# Altium footprint library SparkFun-Connectors.PCBLIB: 409 footprints (part 19 of 26)
Each footprint in its own frame and in the unit in brackets; x right, y up, seen from the top. Pads: shape width x height; smd on the part's side, far side on the other; paste and mask are expansions set on the pad; w line width, h text height; cw(c..) or ccw(c..) is an arc to the next point about the centre after c.
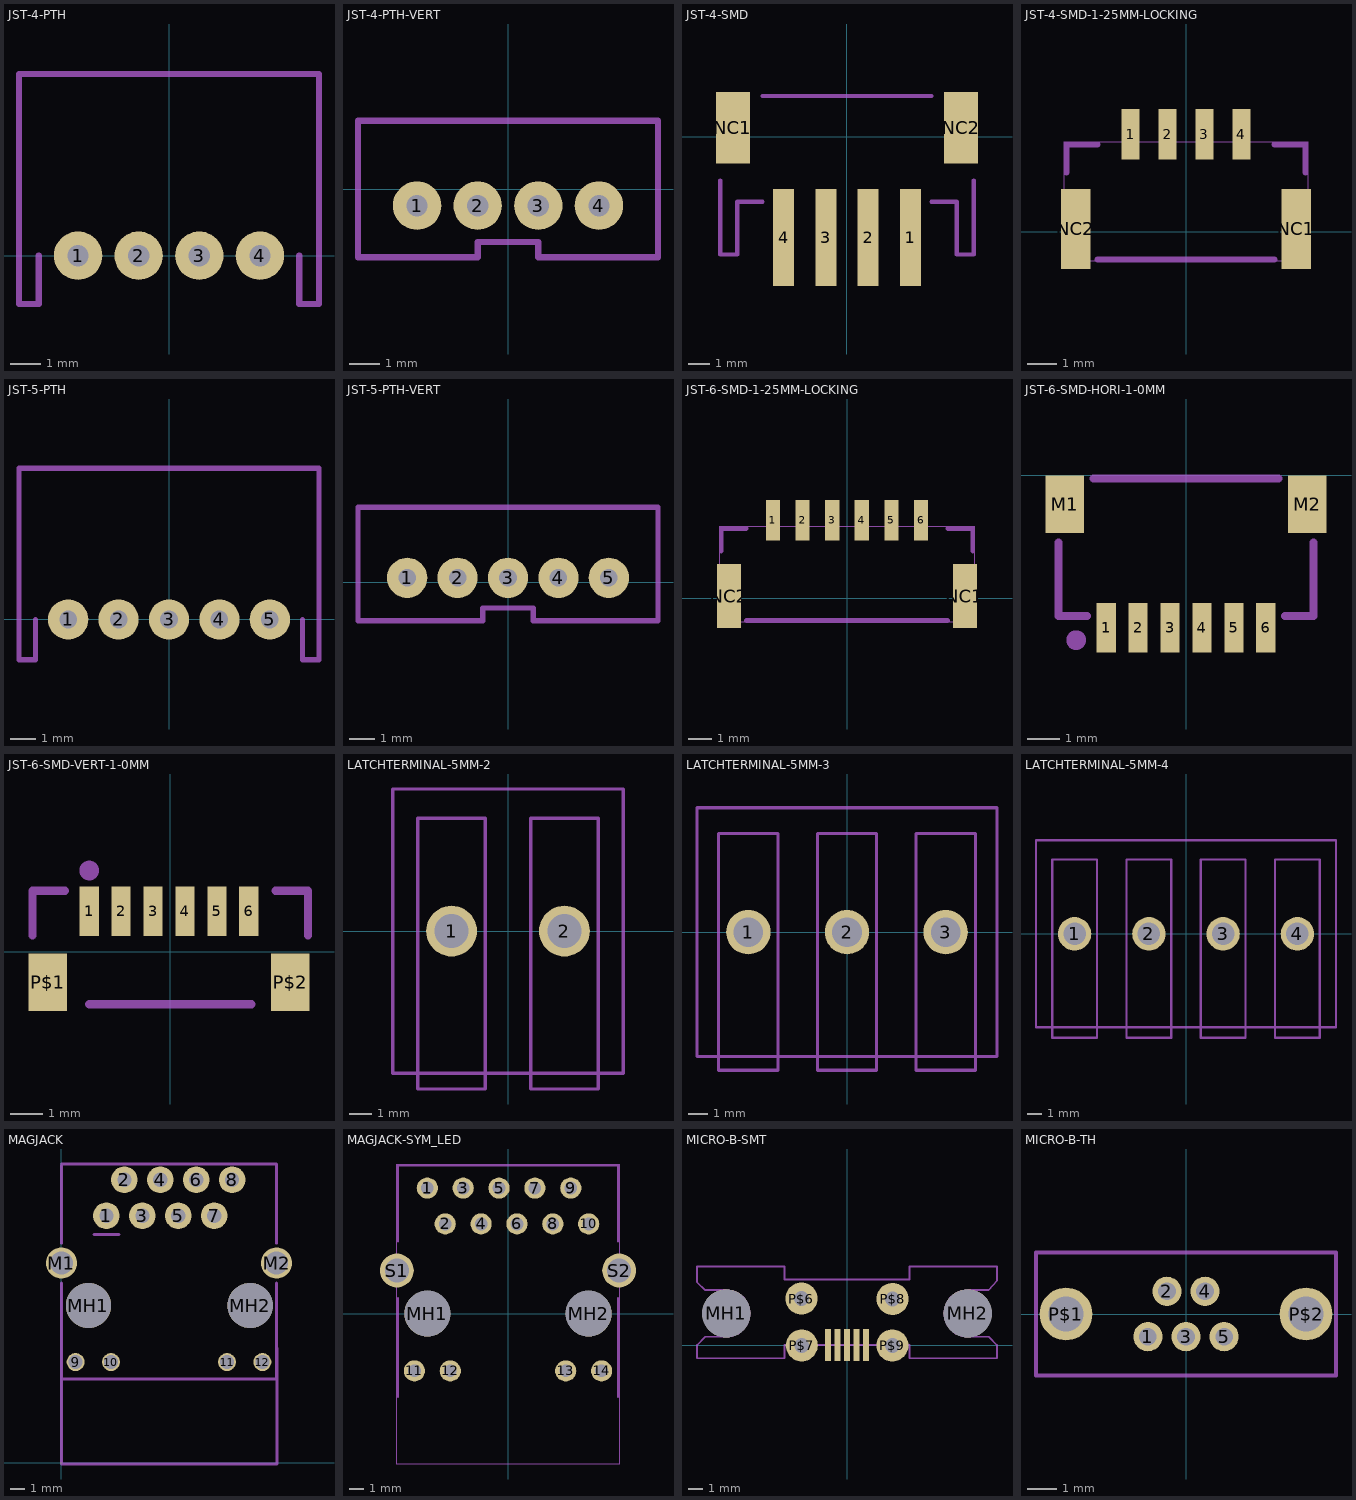
[diagram p18: the footprints below, top view; thin cyan lines are the x and y axes]

## JST-4-PTH [mm]
pads (4):
  round 1.6 hole 0.7: 1(-3,0) 2(-1,0) 3(1,0) 4(3,0)
tDocu:
  text "+" at -3.4,0.7 h1.97
  text "-" at -1.4,0.7 h1.97
  text "S" at 0.7,0.9 h1.24
  text "S" at 2.7,0.9 h1.24
tPlace:
  lines w0.203: -4.3,0 -4.3,-1.6 -4.95,-1.6 -4.95,6 4.95,6 4.95,-1.6 4.3,-1.6 4.3,0

## JST-4-PTH-VERT [mm]
pads (4):
  round 1.6 hole 0.7: 1(-3,-0.55) 2(-1,-0.55) 3(1,-0.55) 4(3,-0.55)
tDocu:
  text "+" at -1.4,0.75 h1.97
  text "-" at 0.6,0.75 h1.97
  text "Y" at 2.7,0.95 h1.24
  text "B" at -3.3,0.95 h1.24
tPlace:
  lines w0.203: -4.95,-2.25 -4.95,2.25 4.95,2.25 4.95,-2.25 1,-2.25 1,-1.75 -1,-1.75 -1,-2.25 -4.95,-2.25

## JST-4-SMD [mm]
pads (6):
  rect 1x4.6 smd: 1(3.01,-4.77) 2(1.01,-4.77) 3(-0.99,-4.77) 4(-2.99,-4.77)
  rect 1.6x3.4 smd: NC1(-5.39,0.43) NC2(5.41,0.43)
tPlace:
  lines w0.203: -5.99,-2.07 -5.99,-5.57 -5.19,-5.57 -5.19,-3.07 -3.99,-3.07 ; -3.99,1.93 4.01,1.93 ; 4.01,-3.07 5.21,-3.07 5.21,-5.57 6.01,-5.57 6.01,-2.07

## JST-4-SMD-1-25MM-LOCKING [mm]
pads (6):
  rect 0.6x1.7 smd: 1(-1.875,3.3) 2(-0.625,3.3) 3(0.625,3.3) 4(1.875,3.3)
  rect 1x2.7 smd: NC1(3.725,0.1) NC2(-3.725,0.1)
tDocu:
  region: -1.975,3.05 -1.975,3.85 -1.775,3.85 -1.775,3.05
  region: -0.725,3.05 -0.725,3.85 -0.525,3.85 -0.525,3.05
  region: 0.525,3.05 0.525,3.85 0.725,3.85 0.725,3.05
  region: 1.775,3.05 1.775,3.85 1.975,3.85 1.975,3.05
  region: 3.625,-1 3.625,1.2 3.825,1.2 3.825,-1
  region: -3.825,-1 -3.825,1.2 -3.625,1.2 -3.625,-1
  lines w0.01: -4.125,-1 4.125,-1 4.125,3.05 -4.125,3.05 -4.125,-1
tPlace:
  lines w0.203: -4.05,2 -4.05,2.95 -3,2.95 ; -3,-0.93 3,-0.93 ; 3,2.95 4.05,2.95 4.05,2

## JST-5-PTH [mm]
pads (5):
  round 1.6 hole 0.7: 1(-4,0) 2(-2,0) 3(0,0) 4(2,0) 5(4,0)
tPlace:
  lines w0.203: -5.3,0 -5.3,-1.6 -5.95,-1.6 -5.95,6 5.95,6 5.95,-1.6 5.3,-1.6 5.3,0

## JST-5-PTH-VERT [mm]
pads (5):
  round 1.6 hole 0.7: 1(-4,0.18) 2(-2,0.18) 3(0,0.18) 4(2,0.18) 5(4,0.18)
tPlace:
  lines w0.203: -5.95,-1.52 -5.95,2.98 5.95,2.98 5.95,-1.52 1,-1.52 1,-1.02 -1,-1.02 -1,-1.52 -5.95,-1.52

## JST-6-SMD-1-25MM-LOCKING [mm]
pads (8):
  rect 0.6x1.7 smd: 1(-3.125,3.3) 2(-1.875,3.3) 3(-0.625,3.3) 4(0.625,3.3) 5(1.875,3.3) 6(3.125,3.3)
  rect 1x2.7 smd: NC1(4.975,0.1) NC2(-4.975,0.1)
tDocu:
  region: -3.225,3.05 -3.225,3.85 -3.025,3.85 -3.025,3.05
  region: -1.975,3.05 -1.975,3.85 -1.775,3.85 -1.775,3.05
  region: -0.725,3.05 -0.725,3.85 -0.525,3.85 -0.525,3.05
  region: 0.525,3.05 0.525,3.85 0.725,3.85 0.725,3.05
  region: 4.875,-1 4.875,1.2 5.075,1.2 5.075,-1
  region: -5.075,-1 -5.075,1.2 -4.875,1.2 -4.875,-1
  region: 1.775,3.05 1.775,3.85 1.975,3.85 1.975,3.05
  region: 3.025,3.05 3.025,3.85 3.225,3.85 3.225,3.05
  lines w0.01: -5.375,-1 5.375,-1 5.375,3.05 -5.375,3.05 -5.375,-1
tPlace:
  lines w0.203: -5.3,2 -5.3,2.95 -4.25,2.95 ; -4.25,-0.93 4.25,-0.93 ; 4.25,2.95 5.3,2.95 5.3,2

## JST-6-SMD-HORI-1-0MM [mil]
pads (8):
  rect 23.62x61.02 smd: 1(-98.43,-187.99) 2(-59.06,-187.99) 3(-19.69,-187.99) 4(19.69,-187.99) 5(59.06,-187.99) 6(98.43,-187.99)
  rect 47.24x70.87 smd: M1(-149.61,-35.43) M2(149.61,-35.43)
tPlace:
  circle w16: c-135.43,-203.15 r4.12
  lines w10: -157.48,-82.68 -157.48,-173.23 -122.05,-173.23 ; -114.17,-3.94 114.17,-3.94 ; 122.05,-173.23 157.48,-173.23 157.48,-82.68

## JST-6-SMD-VERT-1-0MM [mm]
pads (8):
  rect 0.6x1.55 smd: 1(-2.54,1.27) 2(-1.54,1.27) 3(-0.54,1.27) 4(0.46,1.27) 5(1.46,1.27) 6(2.46,1.27)
  rect 1.2x1.8 smd: P$1(-3.84,-0.955) P$2(3.76,-0.955)
tPlace:
  circle w0.406: c-2.54,2.54 r0.105
  lines w0.254: -4.318,0.508 -4.318,1.905 -3.302,1.905 ; -2.54,-1.651 2.54,-1.651 ; 3.302,1.905 4.318,1.905 4.318,0.508

## LATCHTERMINAL-5MM-2 [mil]
pads (2):
  round 88.59 hole 59.06: 1(-98.43,0) 2(98.43,0)
tDocu:
  lines w6: -157.48,-275.59 -157.48,196.85 -39.37,196.85 -39.37,-275.59 -157.48,-275.59 ; 39.37,-275.59 39.37,196.85 157.48,196.85 157.48,-275.59 39.37,-275.59
tPlace:
  lines w6: -200.79,-248.03 -200.79,248.03 200.79,248.03 200.79,-248.03 -200.79,-248.03

## LATCHTERMINAL-5MM-3 [mm]
pads (3):
  round 2.25 hole 1.5: 1(-5,0) 2(0,0) 3(5,0)
tDocu:
  lines w0.152: -6.5,-7 -3.5,-7 -3.5,5 -6.5,5 -6.5,-7 ; -1.5,-7 -1.5,5 1.5,5 1.5,-7 -1.5,-7 ; 3.5,-7 3.5,5 6.5,5 6.5,-7 3.5,-7
tPlace:
  lines w0.152: -7.6,-6.3 7.6,-6.3 7.6,6.3 -7.6,6.3 -7.6,-6.3

## LATCHTERMINAL-5MM-4 [mil]
pads (4):
  round 88.59 hole 59.06: 1(-295.28,0) 2(-98.43,0) 3(98.43,0) 4(295.28,0)
tDocu:
  lines w6: -354.33,-275.59 -236.22,-275.59 -236.22,196.85 -354.33,196.85 -354.33,-275.59 ; -157.48,-275.59 -157.48,196.85 -39.37,196.85 -39.37,-275.59 -157.48,-275.59 ; 39.37,-275.59 39.37,196.85 157.48,196.85 157.48,-275.59 39.37,-275.59 ; 236.22,-275.59 236.22,196.85 354.33,196.85 354.33,-275.59 236.22,-275.59
tPlace:
  lines w6: -397.64,-248.03 397.64,-248.03 397.64,248.03 -397.64,248.03 -397.64,-248.03

## MAGJACK [mil]
pads (16):
  round 74 hole 39.37: 1(125,686.81) 2(175,786.81) 3(225,686.81) 4(275,786.81) 5(325,686.81) 6(375,786.81) 7(425,686.81) 8(475,786.81)
  round 50 hole 39.37: 9(39.37,279.53) 10(137.8,279.53) 11(460.63,279.53) 12(559.06,279.53)
  round 86 hole 62.99: M1(0,555.12) M2(598.43,555.12)
  round 125.98 hole 125.98 unplated: MH1(75,436.81) MH2(525,436.81)
tDocu:
  lines w8: 0,318.7 0,-4.13 600,-4.13 600,318.7
tPlace:
  lines w8: 0,232.09 600,232.09 ; 0,236.22 0,500 ; 0,610.24 0,826.77 ; 0,830.51 596.06,830.51 ; 90,635 160,635 ; 598.43,232.28 598.43,500 ; 598.43,610.24 598.43,830.71
bPlace:
  lines w8: 90,635 160,635

## MAGJACK-SYM_LED [mm]
pads (18):
  round 1.5 hole 0.9: 1(-5.715,8.89) 2(-4.445,6.35) 3(-3.175,8.89) 4(-1.905,6.35) 5(-0.635,8.89) 6(0.635,6.35) 7(1.905,8.89) 8(3.175,6.35) 9(4.445,8.89) 10(5.715,6.35) 11(-6.63,-4.06) 12(-4.09,-4.06) 13(4.09,-4.06) 14(6.63,-4.06)
  round 3.25 hole 3.25 unplated: MH1(-5.715,0) MH2(5.715,0)
  round 2.4 hole 1.7: S1(-7.875,3.05) S2(7.875,3.05)
tDocu:
  lines w0.05: -7.875,-10.655 7.875,-10.655 7.875,10.595 -7.875,10.595 -7.875,-10.655
tPlace:
  lines w0.152: -7.8,-5.89 -7.8,1.11 ; -7.8,5.11 -7.8,10.51 7.8,10.51 7.8,5.11 ; 7.8,-5.89 7.8,1.11

## MICRO-B-SMT [mil]
pads (11):
  rect 15.75x86.61 smd: 1(-51.18,0) 2(-25.59,0) 3(0,0) 4(25.59,0) 5(51.18,0)
  round 129.92 hole 129.92 unplated: MH1(-325.79,85.43) MH2(325.79,85.43)
  round 86.61 hole 40: P$6(-122.86,125.32) P$7(-121.97,-1.06) P$8(122.91,124.42) P$9(122.36,-1.01)
tDocu:
  lines w5: -404.53,-35.43 -404.53,0 -381.89,22.44 -325.79,22.44 ccw(c-325.79,85.44) -325.79,148.43 -381.89,148.43 -404.53,169.29 -404.53,211.81 -168.31,211.81 -168.31,176.38 168.31,176.38 168.31,211.81 404.53,211.81 404.53,173.23 381.89,148.43 325.79,148.43 ccw(c325.79,85.44) 325.79,22.44 381.89,22.44 404.53,0 404.53,-35.43 168.31,-35.43 168.31,0 -168.31,0 -168.31,-35.43 -404.53,-35.43

## MICRO-B-TH [mm]
pads (7):
  round 1 hole 0.6: 1(-1.3,-0.775) 2(-0.65,0.775) 3(0,-0.775) 4(0.65,0.775) 5(1.3,-0.775)
  round 1.8 hole 1.2: P$1(-4.1,0) P$2(4.1,0)
tDocu:
  lines w0.127: -5.125,-2.1 5.125,-2.1 5.125,2.1 -5.125,2.1 -5.125,-2.1